# Altium footprint library Wurth_Elektronik_Electromechanic_Wire_to_Board_Connectors_rev16a.PCBLIB: 662 footprints (part 9 of 42)
Each footprint in its own frame and in the unit in brackets; x right, y up, seen from the top. Pads: shape width x height; smd on the part's side, far side on the other; paste and mask are expansions set on the pad; w line width, h text height; cw(c..) or ccw(c..) is an arc to the next point about the centre after c.
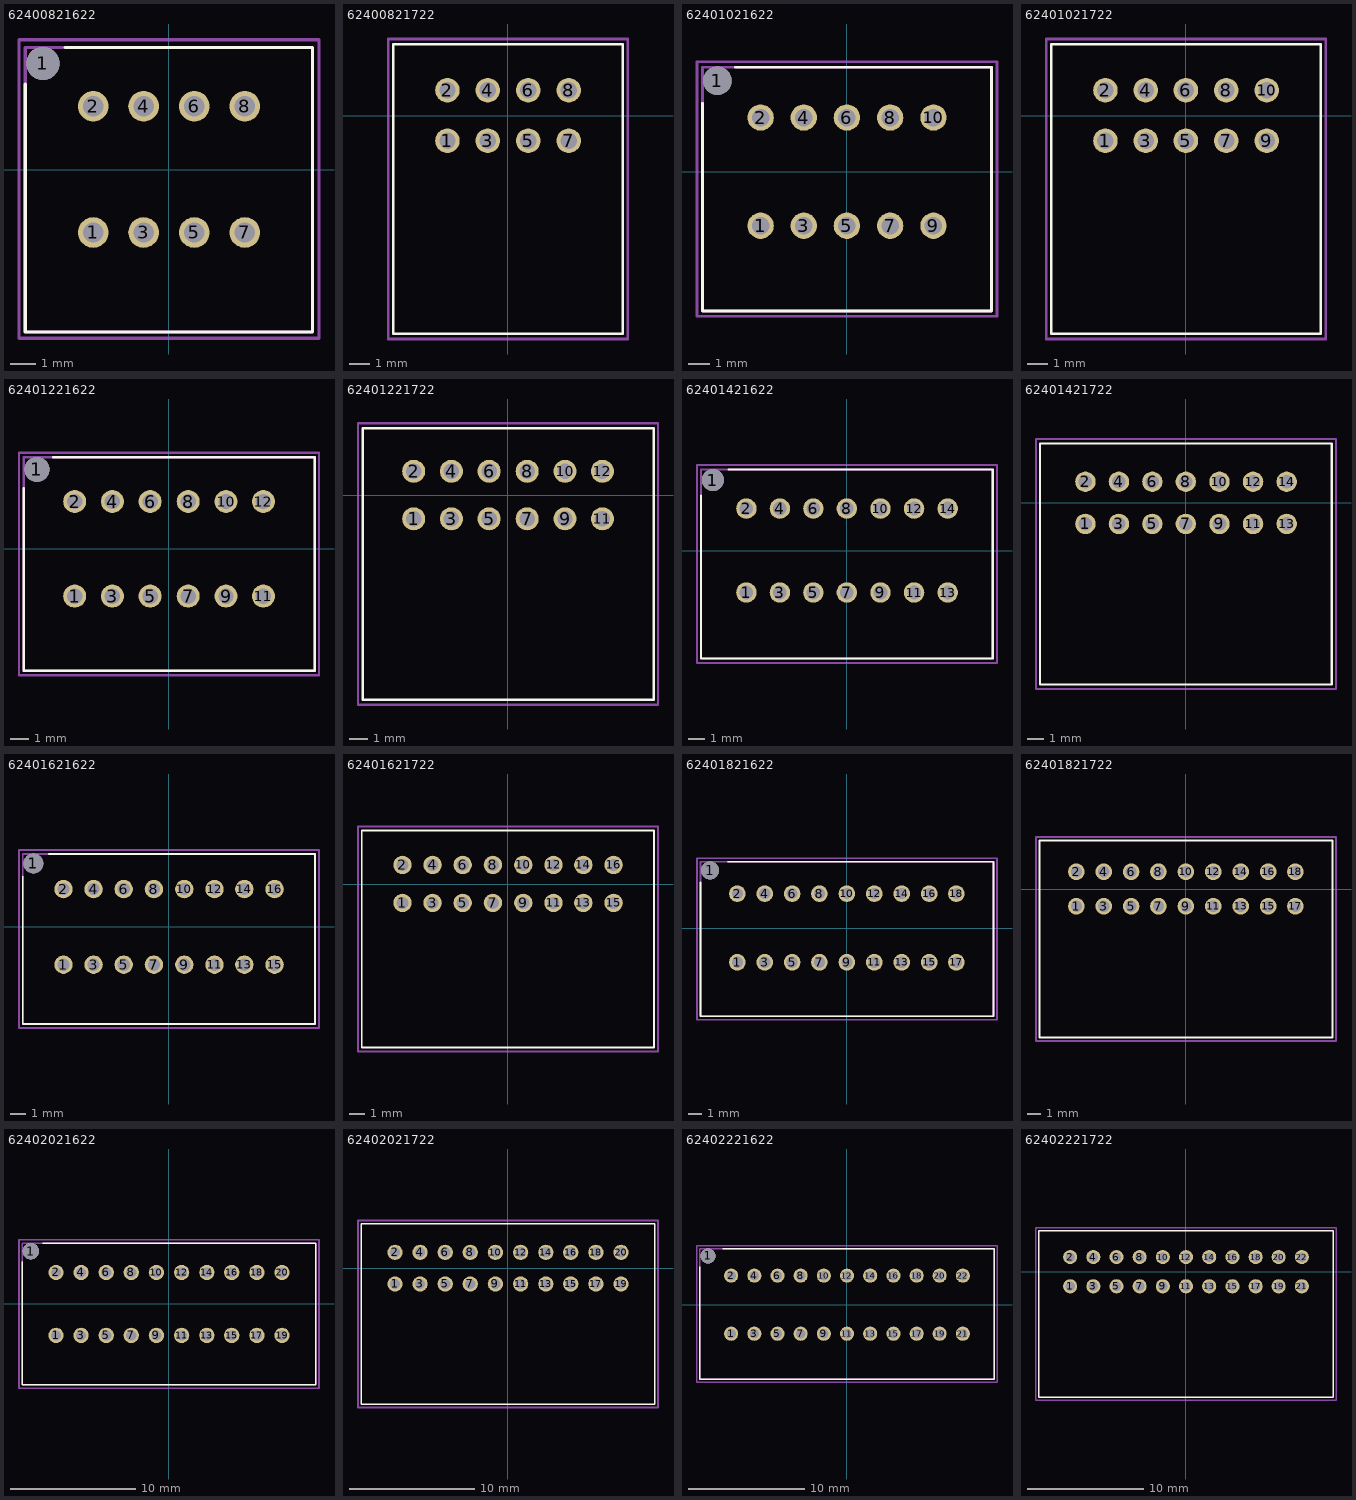
[diagram p8: the footprints below, top view; thin cyan lines are the x and y axes]

## 62400821622 [mil]
pads (9):
  round 52 hole 52: 1(-196.85,166)
  round 48 hole 32: 1(-118.11,-98.43) 2(-118.11,99) 3(-39.37,-98.43) 4(-39.37,99) 5(40,-98.43) 6(40,99) 7(119,-98.43) 8(119,99)
Top Overlay:
  lines w5: -224.41,134 -224.41,-253.94 225,-253.94 225,191 -161.81,191
Mechanical 2:
  text ">NAME" at -116.78,229 h77.5
Mechanical 4:
  text ">VALUE" at -101.79,-339.04 h77.5
Mechanical 16:
  lines w5: -224.41,-253.94 225,-253.94 225,191 -224.41,191 -224.41,-253.94
Mechanical 27:
  lines w5: -234.25,-263.78 235,-263.78 235,203 -234.25,203 -234.25,-263.78

## 62400821722 [mil]
pads (8):
  round 48 hole 32: 1(-118.11,-49.21) 2(-118.11,50) 3(-39.37,-49.21) 4(-39.37,50) 5(40,-49.21) 6(40,50) 7(119,-49.21) 8(119,50)
Top Overlay:
  lines w5: -224.41,-427.17 225,-427.17 225,140 -224.41,140 -224.41,-427.17
Mechanical 2:
  text ">NAME" at -129.92,178 h77.5
Mechanical 4:
  text ">VALUE" at -106.5,-511.02 h77.5
Mechanical 16:
  text "1" at -151.57,-55.12 h77.5
  text "8" at 113,63 h77.5
Mechanical 27:
  lines w5: -234.25,-437.01 235,-437.01 235,150 -234.25,150 -234.25,-437.01

## 62401021622 [mil]
pads (11):
  round 52 hole 52: 1(-236.22,166)
  round 48 hole 32: 1(-157.48,-98.43) 2(-157.48,99) 3(-78.74,-98.43) 4(-78.74,99) 5(0,-98.43) 6(0,99) 7(79,-98.43) 8(79,99) 9(158,-98.43) 10(158,99)
Top Overlay:
  lines w5: -263.78,125 -263.78,-253.94 264,-253.94 264,191 -203.94,191
Mechanical 2:
  text ">NAME" at -147.49,221 h77.5
Mechanical 4:
  text ">VALUE" at -163.21,-340.23 h77.5
Mechanical 16:
  lines w5: -263.78,-253.94 264,-253.94 264,191 -263.78,191 -263.78,-253.94
Mechanical 27:
  lines w5: -273.62,-263.78 274,-263.78 274,201 -273.62,201 -273.62,-263.78

## 62401021722 [mil]
pads (10):
  round 48 hole 32: 1(-157.48,-49.21) 2(-157.48,50) 3(-78.74,-49.21) 4(-78.74,50) 5(0,-49.21) 6(0,50) 7(79,-49.21) 8(79,50) 9(158,-49.21) 10(158,50)
Top Overlay:
  lines w5: -263.78,-427.17 264,-427.17 264,140 -263.78,140 -263.78,-427.17
Mechanical 2:
  text ">NAME" at -110.24,191 h77.5
Mechanical 4:
  text ">VALUE" at -144.29,-527.56 h77.5
Mechanical 16:
  text "1" at -190.94,-55.12 h77.5
  text "10" at 152,63 h77.5
Mechanical 27:
  lines w5: -273.62,-437.01 274,-437.01 274,150 -273.62,150 -273.62,-437.01

## 62401221622 [mil]
pads (13):
  round 52 hole 52: 1(-275.59,166)
  round 48 hole 32: 1(-196.85,-98.43) 2(-196.85,99) 3(-118.11,-98.43) 4(-118.11,99) 5(-39.37,-98.43) 6(-39.37,99) 7(40,-98.43) 8(40,99) 9(119,-98.43) 10(119,99) 11(197,-98.43) 12(197,99)
Top Overlay:
  lines w5: -303.15,127 -303.15,-253.94 304,-253.94 304,191 -242.13,191
Mechanical 2:
  text ">NAME" at -156.54,244 h77.5
Mechanical 4:
  text ">VALUE" at -156.51,-339.44 h77.5
Mechanical 16:
  lines w5: -303.15,-253.94 304,-253.94 304,191 -303.15,191 -303.15,-253.94
Mechanical 27:
  lines w5: -312.6,201 -312.99,201 ; -312.99,201 313,201 313,-263.78 -312.99,-263.78 -312.99,201

## 62401221722 [mil]
pads (12):
  round 48 hole 32: 1(-196.85,-49.21) 2(-196.85,50) 3(-118.11,-49.21) 4(-118.11,50) 5(-39.37,-49.21) 6(-39.37,50) 7(40,-49.21) 8(40,50) 9(119,-49.21) 10(119,50) 11(197,-49.21) 12(197,50)
Top Overlay:
  lines w5: -303.15,-427.17 304,-427.17 304,140 -303.15,140 -303.15,-427.17
Mechanical 2:
  text ">NAME" at -129.92,191 h77.5
Mechanical 4:
  text ">VALUE" at -104.92,-507.87 h77.5
Mechanical 16:
  text "1" at -230.31,-55.12 h77.5
  text "12" at 191,63 h77.5
Mechanical 27:
  lines w5: -312.99,-437.01 313,-437.01 313,150 -312.99,150 -312.99,-437.01

## 62401421622 [mil]
pads (15):
  round 52 hole 52: 1(-314.96,166)
  round 48 hole 32: 1(-236.22,-98.43) 2(-236.22,99) 3(-157.48,-98.43) 4(-157.48,99) 5(-78.74,-98.43) 6(-78.74,99) 7(0,-98.43) 8(0,99) 9(79,-98.43) 10(79,99) 11(158,-98.43) 12(158,99) 13(237,-98.43) 14(237,99)
Top Overlay:
  lines w5: -342.52,130 -342.52,-253.94 343,-253.94 343,191 -278.35,191
Mechanical 2:
  text ">NAME" at -154.97,245 h77.5
Mechanical 4:
  text ">VALUE" at -160.84,-348.1 h77.5
Mechanical 16:
  lines w5: -342.52,-253.94 343,-253.94 343,191 -342.52,191 -342.52,-253.94
Mechanical 27:
  lines w5: -352.36,-263.78 353,-263.78 353,201 -352.36,201 -352.36,-263.78

## 62401421722 [mil]
pads (14):
  round 48 hole 32: 1(-236.22,-49.21) 2(-236.22,50) 3(-157.48,-49.21) 4(-157.48,50) 5(-78.74,-49.21) 6(-78.74,50) 7(0,-49.21) 8(0,50) 9(79,-49.21) 10(79,50) 11(158,-49.21) 12(158,50) 13(237,-49.21) 14(237,50)
Top Overlay:
  lines w5: -342.52,-427.17 343,-427.17 343,140 -342.52,140 -342.52,-427.17
Mechanical 2:
  text ">NAME" at -110.24,182 h77.5
Mechanical 4:
  text ">VALUE" at -144.29,-518.5 h77.5
Mechanical 16:
  text "1" at -269.69,-55.12 h77.5
  text "14" at 231,63 h77.5
Mechanical 27:
  lines w5: -352.36,-437.01 353,-437.01 353,150 -352.36,150 -352.36,-437.01

## 62401621622 [mil]
pads (17):
  round 52 hole 52: 1(-354.33,166)
  round 48 hole 32: 1(-275.59,-98.43) 2(-275.59,99) 3(-196.85,-98.43) 4(-196.85,99) 5(-118.11,-98.43) 6(-118.11,99) 7(-39.37,-98.43) 8(-39.37,99) 9(40,-98.43) 10(40,99) 11(119,-98.43) 12(119,99) 13(197,-98.43) 14(197,99) 15(276,-98.43) 16(276,99)
Top Overlay:
  lines w5: -381.89,132 -381.89,-253.94 382,-253.94 382,191 -312.99,191
Mechanical 2:
  text ">NAME" at -135.28,234 h77.5
Mechanical 4:
  text ">VALUE" at -146.28,-346.52 h77.5
Mechanical 16:
  lines w5: -381.89,-253.94 382,-253.94 382,191 -381.89,191 -381.89,-253.94
Mechanical 27:
  lines w5: -391.73,-263.78 392,-263.78 392,201 -391.73,201 -391.73,-263.78

## 62401621722 [mil]
pads (16):
  round 48 hole 32: 1(-275.59,-49.21) 2(-275.59,50) 3(-196.85,-49.21) 4(-196.85,50) 5(-118.11,-49.21) 6(-118.11,50) 7(-39.37,-49.21) 8(-39.37,50) 9(40,-49.21) 10(40,50) 11(119,-49.21) 12(119,50) 13(197,-49.21) 14(197,50) 15(276,-49.21) 16(276,50)
Top Overlay:
  lines w5: -381.89,-427.17 382,-427.17 382,140 -381.89,140 -381.89,-427.17
Mechanical 2:
  text ">NAME" at -129.92,191 h77.5
Mechanical 4:
  text ">VALUE" at -144.29,-507.87 h77.5
Mechanical 16:
  text "1" at -309.06,-55.12 h77.5
  text "16" at 270,63 h77.5
Mechanical 27:
  lines w5: -391.73,-437.01 392,-437.01 392,150 -391.73,150 -391.73,-437.01

## 62401821622 [mil]
pads (19):
  round 52 hole 52: 1(-393.7,166)
  round 48 hole 32: 1(-314.96,-98.43) 2(-314.96,99) 3(-236.22,-98.43) 4(-236.22,99) 5(-157.48,-98.43) 6(-157.48,99) 7(-78.74,-98.43) 8(-78.74,99) 9(0,-98.43) 10(0,99) 11(79,-98.43) 12(79,99) 13(158,-98.43) 14(158,99) 15(237,-98.43) 16(237,99) 17(315,-98.43) 18(315,99)
Top Overlay:
  lines w5: -421.26,131 -421.26,-253.94 422,-253.94 422,191 -342.13,191
Mechanical 2:
  text ">NAME" at -121.11,238 h77.5
Mechanical 4:
  text ">VALUE" at -141.16,-328.41 h77.5
Mechanical 16:
  lines w5: -421.26,-253.94 422,-253.94 422,191 -421.26,191 -421.26,-253.94
Mechanical 27:
  lines w5: -431.1,-263.78 432,-263.78 432,201 -431.1,201 -431.1,-263.78

## 62401821722 [mil]
pads (18):
  round 48 hole 32: 1(-314.96,-49.21) 2(-314.96,50) 3(-236.22,-49.21) 4(-236.22,50) 5(-157.48,-49.21) 6(-157.48,50) 7(-78.74,-49.21) 8(-78.74,50) 9(0,-49.21) 10(0,50) 11(79,-49.21) 12(79,50) 13(158,-49.21) 14(158,50) 15(237,-49.21) 16(237,50) 17(315,-49.21) 18(315,50)
Top Overlay:
  lines w5: -421.26,-427.17 422,-427.17 422,140 -421.26,140 -421.26,-427.17
Mechanical 2:
  text ">NAME" at -129.92,191 h77.5
Mechanical 4:
  text ">VALUE" at -124.61,-507.87 h77.5
Mechanical 16:
  text "1" at -348.43,-55.12 h77.5
  text "18" at 309,63 h77.5
Mechanical 27:
  lines w5: -431.1,-437.01 432,-437.01 432,150 -431.1,150 -431.1,-437.01

## 62402021622 [mil]
pads (21):
  round 52 hole 52: 1(-433.07,166)
  round 48 hole 32: 1(-354.33,-98.43) 2(-354.33,99) 3(-275.59,-98.43) 4(-275.59,99) 5(-196.85,-98.43) 6(-196.85,99) 7(-118.11,-98.43) 8(-118.11,99) 9(-39.37,-98.43) 10(-39.37,99) 11(40,-98.43) 12(40,99) 13(119,-98.43) 14(119,99) 15(197,-98.43) 16(197,99) 17(276,-98.43) 18(276,99) 19(355,-98.43) 20(355,99)
Top Overlay:
  lines w5: -460.63,132 -460.63,-253.94 461,-253.94 461,191 -396.46,191
Mechanical 2:
  text ">NAME" at -114.42,237 h77.5
Mechanical 4:
  text ">VALUE" at -124.62,-352.43 h77.5
Mechanical 16:
  lines w5: -460.63,-253.94 461,-253.94 461,191 -460.63,191 -460.63,-253.94
Mechanical 27:
  lines w5: -470.47,-263.78 471,-263.78 471,201 -470.47,201 -470.47,-263.78

## 62402021722 [mil]
pads (20):
  round 48 hole 32: 1(-354.33,-49.21) 2(-354.33,50) 3(-275.59,-49.21) 4(-275.59,50) 5(-196.85,-49.21) 6(-196.85,50) 7(-118.11,-49.21) 8(-118.11,50) 9(-39.37,-49.21) 10(-39.37,50) 11(40,-49.21) 12(40,50) 13(119,-49.21) 14(119,50) 15(197,-49.21) 16(197,50) 17(276,-49.21) 18(276,50) 19(355,-49.21) 20(355,50)
Top Overlay:
  lines w5: -460.63,-427.17 461,-427.17 461,140 -460.63,140 -460.63,-427.17
Mechanical 2:
  text ">NAME" at -169.29,191 h77.5
Mechanical 4:
  text ">VALUE" at -144.29,-507.87 h77.5
Mechanical 16:
  text "1" at -387.8,-55.12 h77.5
  text "20" at 349,63 h77.5
Mechanical 27:
  lines w5: -470.47,-437.01 471,-437.01 471,150 -470.47,150 -470.47,-437.01

## 62402221622 [mil]
pads (23):
  round 52 hole 52: 1(-472.44,166)
  round 48 hole 32: 1(-393.7,-98.43) 2(-393.7,99) 3(-314.96,-98.43) 4(-314.96,99) 5(-236.22,-98.43) 6(-236.22,99) 7(-157.48,-98.43) 8(-157.48,99) 9(-78.74,-98.43) 10(-78.74,99) 11(0,-98.43) 12(0,99) 13(79,-98.43) 14(79,99) 15(158,-98.43) 16(158,99) 17(237,-98.43) 18(237,99) 19(315,-98.43) 20(315,99) 21(394,-98.43) 22(394,99)
Top Overlay:
  lines w5: -500,129 -500,-253.94 500,-253.94 500,191 -422.44,191
Mechanical 2:
  text ">NAME" at -136.47,229 h77.5
Mechanical 4:
  text ">VALUE" at -101.79,-348.1 h77.5
Mechanical 16:
  lines w5: -500,-253.94 500,-253.94 500,191 -500,191 -500,-253.94
Mechanical 27:
  lines w5: -509.84,-263.78 510,-263.78 510,201 -509.84,201 -509.84,-263.78

## 62402221722 [mil]
pads (22):
  round 48 hole 32: 1(-393.7,-49.21) 2(-393.7,50) 3(-314.96,-49.21) 4(-314.96,50) 5(-236.22,-49.21) 6(-236.22,50) 7(-157.48,-49.21) 8(-157.48,50) 9(-78.74,-49.21) 10(-78.74,50) 11(0,-49.21) 12(0,50) 13(79,-49.21) 14(79,50) 15(158,-49.21) 16(158,50) 17(237,-49.21) 18(237,50) 19(315,-49.21) 20(315,50) 21(394,-49.21) 22(394,50)
Top Overlay:
  lines w5: -500,-427.17 500,-427.17 500,140 -500,140 -500,-427.17
Mechanical 2:
  text ">NAME" at -169.29,191 h77.5
Mechanical 4:
  text ">VALUE" at -163.98,-507.87 h77.5
Mechanical 16:
  text "1" at -427.17,-55.12 h77.5
  text "22" at 388,63 h77.5
Mechanical 27:
  lines w5: -509.84,-437.01 510,-437.01 510,150 -509.84,150 -509.84,-437.01